# Altium footprint library IC.PcbLib: 386 footprints (part 17 of 30)
Each footprint in its own frame and in the unit in brackets; x right, y up, seen from the top. Pads: shape width x height; smd on the part's side, far side on the other; paste and mask are expansions set on the pad; w line width, h text height; cw(c..) or ccw(c..) is an arc to the next point about the centre after c.
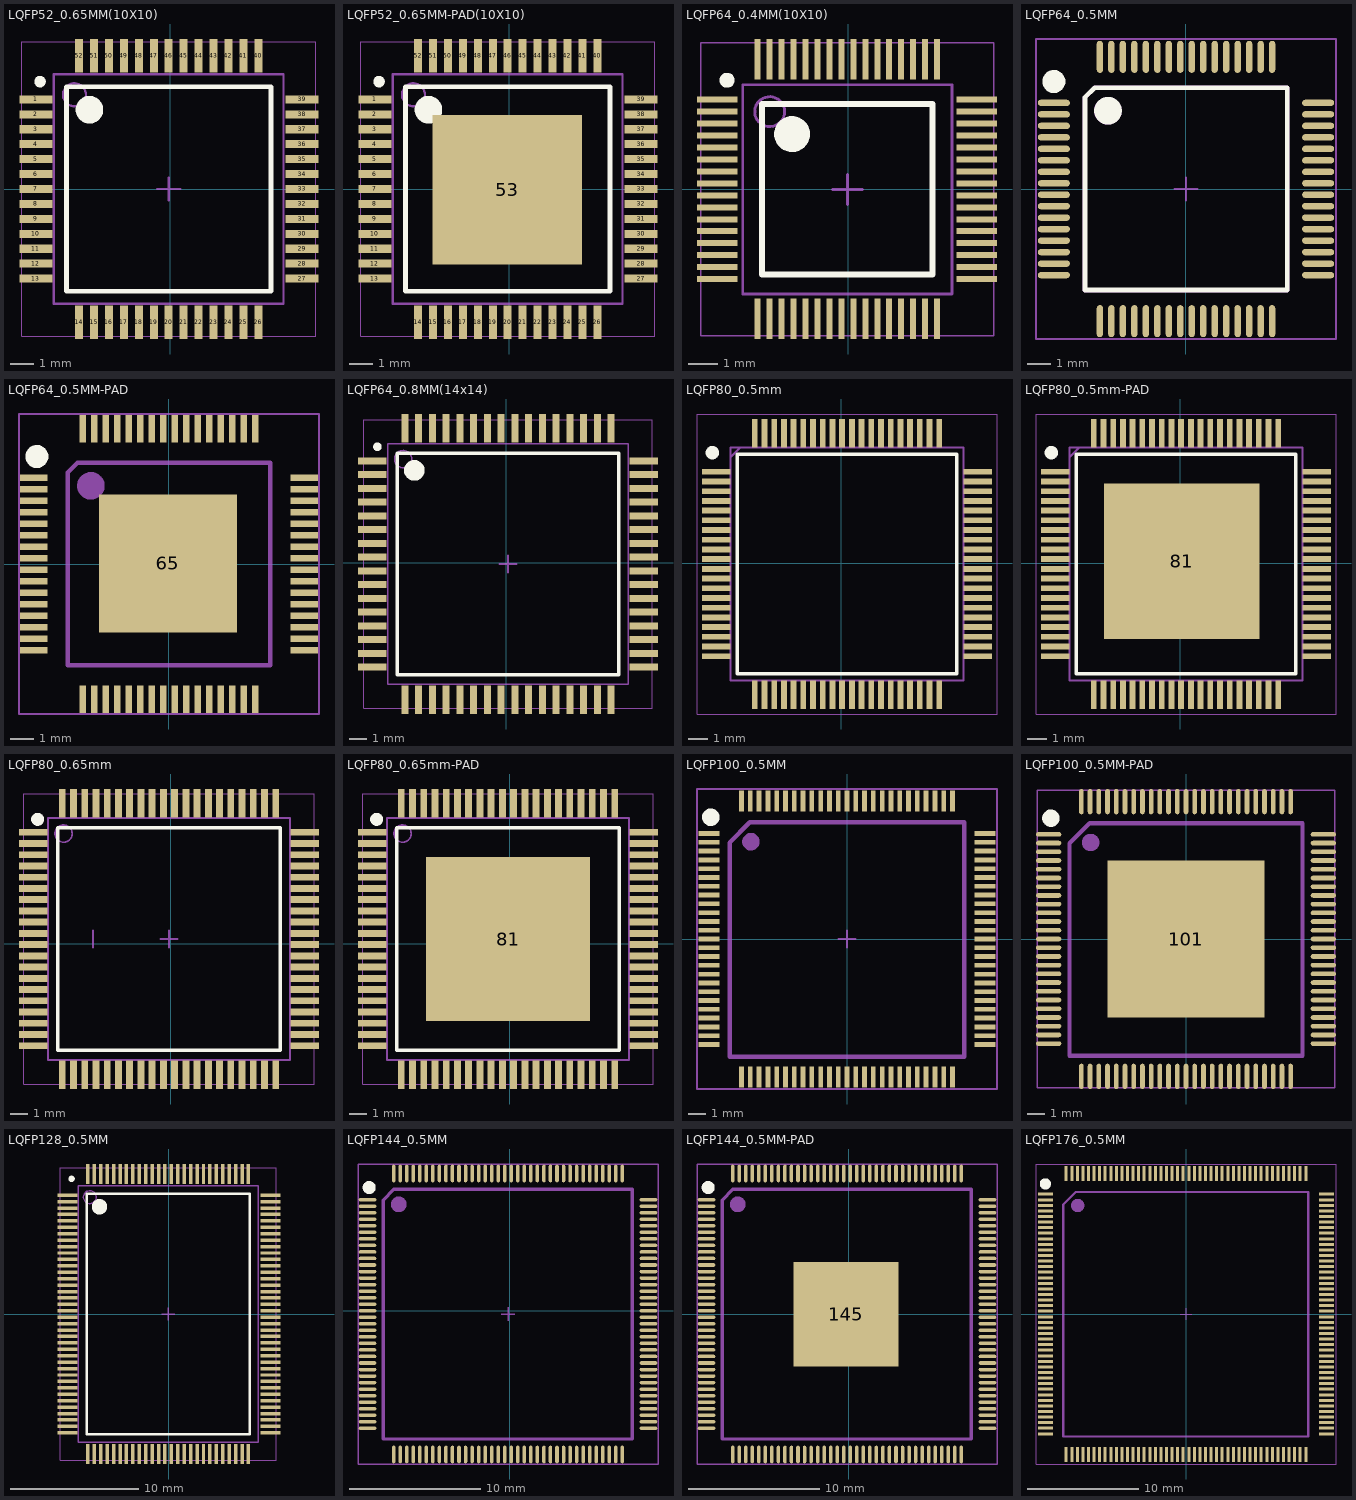
[diagram p16: the footprints below, top view; thin cyan lines are the x and y axes]

## LQFP52_0.65MM(10X10) [mm]
pads (52):
  rect 1.45x0.35 smd: 1(-5.854,3.9) 2(-5.854,3.25) 3(-5.854,2.6) 4(-5.854,1.95) 5(-5.854,1.3) 6(-5.854,0.65) 7(-5.854,0) 8(-5.854,-0.65) 9(-5.854,-1.3) 10(-5.854,-1.95) 11(-5.854,-2.6) 12(-5.854,-3.25) 13(-5.854,-3.9) 27(5.727,-3.9) 28(5.727,-3.25) 29(5.727,-2.6) 30(5.727,-1.95) 31(5.727,-1.3) 32(5.727,-0.65) 33(5.727,0) 34(5.727,0.65) 35(5.727,1.3) 36(5.727,1.95) 37(5.727,2.6) 38(5.727,3.25) 39(5.727,3.9)
  rect 0.35x1.45 smd: 14(-3.976,-5.803) 15(-3.326,-5.803) 16(-2.676,-5.803) 17(-2.026,-5.803) 18(-1.376,-5.803) 19(-0.726,-5.803) 20(-0.076,-5.803) 21(0.574,-5.803) 22(1.224,-5.803) 23(1.874,-5.803) 24(2.524,-5.803) 25(3.174,-5.803) 26(3.824,-5.803) 40(3.824,5.803) 41(3.174,5.803) 42(2.524,5.803) 43(1.874,5.803) 44(1.224,5.803) 45(0.574,5.803) 46(-0.076,5.803) 47(-0.726,5.803) 48(-1.376,5.803) 49(-2.026,5.803) 50(-2.676,5.803) 51(-3.326,5.803) 52(-3.976,5.803)
Top Overlay:
  circle w0.25: c-5.676,4.675 r0.125
  circle w0.6: c-3.526,3.45 r0.3
  lines w0.2: -4.526,-4.45 -4.526,4.45 4.374,4.45 4.374,-4.45 -4.526,-4.45
Mechanical 13:
  circle w0.1: c-4.176,4.1 r0.5
  lines w0.1: -5.076,-5 -5.076,5 4.924,5 4.924,-5 -5.076,-5
Mechanical 15:
  lines w0.05: -6.476,-6.4 -6.476,6.4 6.324,6.4 6.324,-6.4 -6.476,-6.4
  lines w0.1: -0.576,0 0.424,0 ; -0.076,-0.5 -0.076,0.5
3D body "User Library-IPC QFP-full.step": height 1.35, standoff 0, extent -6.094,-6.018 5.942,6.018

## LQFP52_0.65MM-PAD(10X10) [mm]
pads (53):
  rect 1.45x0.35 smd: 1(-5.854,3.9) 2(-5.854,3.25) 3(-5.854,2.6) 4(-5.854,1.95) 5(-5.854,1.3) 6(-5.854,0.65) 7(-5.854,0) 8(-5.854,-0.65) 9(-5.854,-1.3) 10(-5.854,-1.95) 11(-5.854,-2.6) 12(-5.854,-3.25) 13(-5.854,-3.9) 27(5.727,-3.9) 28(5.727,-3.25) 29(5.727,-2.6) 30(5.727,-1.95) 31(5.727,-1.3) 32(5.727,-0.65) 33(5.727,0) 34(5.727,0.65) 35(5.727,1.3) 36(5.727,1.95) 37(5.727,2.6) 38(5.727,3.25) 39(5.727,3.9)
  rect 0.35x1.45 smd: 14(-3.976,-5.803) 15(-3.326,-5.803) 16(-2.676,-5.803) 17(-2.026,-5.803) 18(-1.376,-5.803) 19(-0.726,-5.803) 20(-0.076,-5.803) 21(0.574,-5.803) 22(1.224,-5.803) 23(1.874,-5.803) 24(2.524,-5.803) 25(3.174,-5.803) 26(3.824,-5.803) 40(3.824,5.803) 41(3.174,5.803) 42(2.524,5.803) 43(1.874,5.803) 44(1.224,5.803) 45(0.574,5.803) 46(-0.076,5.803) 47(-0.726,5.803) 48(-1.376,5.803) 49(-2.026,5.803) 50(-2.676,5.803) 51(-3.326,5.803) 52(-3.976,5.803)
  rect 6.5x6.5 smd: 53(-0.102,-0.025)
Top Overlay:
  circle w0.25: c-5.676,4.675 r0.125
  circle w0.6: c-3.526,3.45 r0.3
  lines w0.2: -4.526,-4.45 -4.526,4.45 4.374,4.45 4.374,-4.45 -4.526,-4.45
Mechanical 13:
  circle w0.1: c-4.176,4.1 r0.5
  lines w0.1: -5.076,-5 -5.076,5 4.924,5 4.924,-5 -5.076,-5
Mechanical 15:
  lines w0.05: -6.476,-6.4 -6.476,6.4 6.324,6.4 6.324,-6.4 -6.476,-6.4
  lines w0.1: -0.576,0 0.424,0 ; -0.076,-0.5 -0.076,0.5
3D body "User Library-IPC QFP-full.step": height 1.35, standoff 0, extent -6.094,-6.018 5.942,6.018

## LQFP64_0.4MM(10X10) [mm]
height 1.6
pads (64):
  rect 1.35x0.2 smd: 1(-4.381,3) 2(-4.381,2.6) 3(-4.381,2.2) 4(-4.381,1.8) 5(-4.381,1.4) 6(-4.381,1) 7(-4.381,0.6) 8(-4.381,0.2) 9(-4.381,-0.2) 10(-4.381,-0.6) 11(-4.381,-1) 12(-4.381,-1.4) 13(-4.381,-1.8) 14(-4.381,-2.2) 15(-4.381,-2.6) 16(-4.381,-3) 33(4.304,-3) 34(4.304,-2.6) 35(4.304,-2.2) 36(4.304,-1.8) 37(4.304,-1.4) 38(4.304,-1) 39(4.304,-0.6) 40(4.304,-0.2) 41(4.304,0.2) 42(4.304,0.6) 43(4.304,1) 44(4.304,1.4) 45(4.304,1.8) 46(4.304,2.2) 47(4.304,2.6) 48(4.304,3)
  rect 0.2x1.35 smd: 17(-3.025,-4.33) 18(-2.625,-4.33) 19(-2.225,-4.33) 20(-1.825,-4.33) 21(-1.425,-4.33) 22(-1.025,-4.33) 23(-0.625,-4.33) 24(-0.225,-4.33) 25(0.175,-4.33) 26(0.575,-4.33) 27(0.975,-4.33) 28(1.375,-4.33) 29(1.775,-4.33) 30(2.175,-4.33) 31(2.575,-4.33) 32(2.975,-4.33) 49(2.975,4.355) 50(2.575,4.355) 51(2.175,4.355) 52(1.775,4.355) 53(1.375,4.355) 54(0.975,4.355) 55(0.575,4.355) 56(0.175,4.355) 57(-0.225,4.355) 58(-0.625,4.355) 59(-1.025,4.355) 60(-1.425,4.355) 61(-1.825,4.355) 62(-2.225,4.355) 63(-2.625,4.355) 64(-3.025,4.355)
Top Overlay:
  circle w0.6: c-1.875,1.85 r0.3
  circle w0.25: c-4.05,3.65 r0.125
  lines w0.2: -2.875,-2.85 2.825,-2.85 2.825,2.85 -2.875,2.85 -2.875,-2.85
Mechanical 13:
  circle w0.1: c-2.625,2.6 r0.5
  lines w0.1: -3.525,-3.5 3.475,-3.5 3.475,3.5 -3.525,3.5 -3.525,-3.5
Mechanical 15:
  lines w0.05: -4.925,-4.9 4.875,-4.9 4.875,4.9 -4.925,4.9 -4.925,-4.9
  lines w0.1: -0.525,0 0.475,0 ; -0.025,-0.5 -0.025,0.5
3D body "User Library-LQFP64_7x7mm.step": height 1.6, standoff 0.02, extent -4.525,-4.474 4.475,4.526

## LQFP64_0.5MM [mm]
height 1.6
pads (64):
  oval 1.4x0.27 smd: 1(-5.75,3.75) 2(-5.75,3.25) 3(-5.75,2.75) 4(-5.75,2.25) 5(-5.75,1.75) 6(-5.75,1.25) 7(-5.75,0.75) 8(-5.75,0.25) 9(-5.75,-0.25) 10(-5.75,-0.75) 11(-5.75,-1.25) 12(-5.75,-1.75) 13(-5.75,-2.25) 14(-5.75,-2.75) 15(-5.75,-3.25) 16(-5.75,-3.75) 33(5.75,-3.75) 34(5.75,-3.25) 35(5.75,-2.75) 36(5.75,-2.25) 37(5.75,-1.75) 38(5.75,-1.25) 39(5.75,-0.75) 40(5.75,-0.25) 41(5.75,0.25) 42(5.75,0.75) 43(5.75,1.25) 44(5.75,1.75) 45(5.75,2.25) 46(5.75,2.75) 47(5.75,3.25) 48(5.75,3.75)
  oval 0.27x1.4 smd: 17(-3.75,-5.75) 18(-3.25,-5.75) 19(-2.75,-5.75) 20(-2.25,-5.75) 21(-1.75,-5.75) 22(-1.25,-5.75) 23(-0.75,-5.75) 24(-0.25,-5.75) 25(0.25,-5.75) 26(0.75,-5.75) 27(1.25,-5.75) 28(1.75,-5.75) 29(2.25,-5.75) 30(2.75,-5.75) 31(3.25,-5.75) 32(3.75,-5.75) 49(3.75,5.75) 50(3.25,5.75) 51(2.75,5.75) 52(2.25,5.75) 53(1.75,5.75) 54(1.25,5.75) 55(0.75,5.75) 56(0.25,5.75) 57(-0.25,5.75) 58(-0.75,5.75) 59(-1.25,5.75) 60(-1.75,5.75) 61(-2.25,5.75) 62(-2.75,5.75) 63(-3.25,5.75) 64(-3.75,5.75)
Top Overlay:
  circle w0.5: c-5.75,4.678 r0.25
  circle w0.6: c-3.394,3.406 r0.3
  lines w0.2: -4.394,-4.394 4.406,-4.394 4.406,4.406 -3.976,4.406 -4.394,3.988 -4.394,-4.394
Mechanical 15:
  circle w0.6: c-3.4,3.4 r0.3
  lines w0.1: -0.5,0 0.5,0 ; 0,-0.5 0,0.5 ; -6.528,-6.528 6.528,-6.528 6.528,6.528 -6.528,6.528 -6.528,-6.528
  lines w0.2: -4.4,-4.4 -4.4,3.982 -3.982,4.4 4.4,4.4 4.4,-4.4 -4.4,-4.4
3D body "LQFP64_Grid_0.5.STEP": height 1.6, standoff 0, extent -6.006,-6.009 5.994,5.991

## LQFP64_0.5MM-PAD [mm]
height 1.6
pads (65):
  rect 1.2x0.27 smd: 1(-5.877,3.75) 2(-5.877,3.25) 3(-5.877,2.75) 4(-5.877,2.25) 5(-5.877,1.75) 6(-5.877,1.25) 7(-5.877,0.75) 8(-5.877,0.25) 9(-5.877,-0.25) 10(-5.877,-0.75) 11(-5.877,-1.25) 12(-5.877,-1.75) 13(-5.877,-2.25) 14(-5.877,-2.75) 15(-5.877,-3.25) 16(-5.877,-3.75) 33(5.877,-3.75) 34(5.877,-3.25) 35(5.877,-2.75) 36(5.877,-2.25) 37(5.877,-1.75) 38(5.877,-1.25) 39(5.877,-0.75) 40(5.877,-0.25) 41(5.877,0.25) 42(5.877,0.75) 43(5.877,1.25) 44(5.877,1.75) 45(5.877,2.25) 46(5.877,2.75) 47(5.877,3.25) 48(5.877,3.75)
  rect 0.27x1.2 smd: 17(-3.75,-5.877) 18(-3.25,-5.877) 19(-2.75,-5.877) 20(-2.25,-5.877) 21(-1.75,-5.877) 22(-1.25,-5.877) 23(-0.75,-5.877) 24(-0.25,-5.877) 25(0.25,-5.877) 26(0.75,-5.877) 27(1.25,-5.877) 28(1.75,-5.877) 29(2.25,-5.877) 30(2.75,-5.877) 31(3.25,-5.877) 32(3.75,-5.877) 49(3.75,5.877) 50(3.25,5.877) 51(2.75,5.877) 52(2.25,5.877) 53(1.75,5.877) 54(1.25,5.877) 55(0.75,5.877) 56(0.25,5.877) 57(-0.25,5.877) 58(-0.75,5.877) 59(-1.25,5.877) 60(-1.75,5.877) 61(-2.25,5.877) 62(-2.75,5.877) 63(-3.25,5.877) 64(-3.75,5.877)
  rect 6x6 smd: 65(-0.051,0.025)
Top Overlay:
  circle w0.5: c-5.75,4.678 r0.25
Mechanical 15:
  circle w0.6: c-3.4,3.4 r0.3
  lines w0.1: -0.5,0 0.5,0 ; 0,-0.5 0,0.5 ; -6.528,-6.528 6.528,-6.528 6.528,6.528 -6.528,6.528 -6.528,-6.528
  lines w0.2: -4.4,-4.4 -4.4,3.982 -3.982,4.4 4.4,4.4 4.4,-4.4 -4.4,-4.4
3D body "LQFP64_Grid_0.5.STEP": height 1.6, standoff 0, extent -6.006,-6.009 5.994,5.991

## LQFP64_0.8MM(14x14) [mm]
height 1.6
pads (64):
  rect 1.65x0.4 smd: 1(-7.803,5.924) 2(-7.803,5.124) 3(-7.803,4.324) 4(-7.803,3.524) 5(-7.803,2.724) 6(-7.803,1.924) 7(-7.803,1.124) 8(-7.803,0.324) 9(-7.803,-0.476) 10(-7.803,-1.276) 11(-7.803,-2.076) 12(-7.803,-2.876) 13(-7.803,-3.676) 14(-7.803,-4.476) 15(-7.803,-5.276) 16(-7.803,-6.076) 33(8.006,-6.076) 34(8.006,-5.276) 35(8.006,-4.476) 36(8.006,-3.676) 37(8.006,-2.876) 38(8.006,-2.076) 39(8.006,-1.276) 40(8.006,-0.476) 41(8.006,0.324) 42(8.006,1.124) 43(8.006,1.924) 44(8.006,2.724) 45(8.006,3.524) 46(8.006,4.324) 47(8.006,5.124) 48(8.006,5.924)
  rect 0.4x1.65 smd: 17(-5.898,-7.981) 18(-5.098,-7.981) 19(-4.298,-7.981) 20(-3.498,-7.981) 21(-2.698,-7.981) 22(-1.898,-7.981) 23(-1.098,-7.981) 24(-0.298,-7.981) 25(0.502,-7.981) 26(1.302,-7.981) 27(2.102,-7.981) 28(2.902,-7.981) 29(3.702,-7.981) 30(4.502,-7.981) 31(5.302,-7.981) 32(6.102,-7.981) 49(6.102,7.829) 50(5.302,7.829) 51(4.502,7.829) 52(3.702,7.829) 53(2.902,7.829) 54(2.102,7.829) 55(1.302,7.829) 56(0.502,7.829) 57(-0.298,7.829) 58(-1.098,7.829) 59(-1.898,7.829) 60(-2.698,7.829) 61(-3.498,7.829) 62(-4.298,7.829) 63(-5.098,7.829) 64(-5.898,7.829)
Top Overlay:
  circle w0.6: c-5.348,5.374 r0.3
  circle w0.25: c-7.498,6.749 r0.125
  lines w0.2: -6.348,-6.526 6.552,-6.526 6.552,6.374 -6.348,6.374 -6.348,-6.526
Mechanical 13:
  circle w0.1: c-5.998,6.024 r0.5
  lines w0.1: -6.898,-7.076 7.102,-7.076 7.102,6.924 -6.898,6.924 -6.898,-7.076
Mechanical 15:
  lines w0.05: -8.298,-8.476 8.502,-8.476 8.502,8.324 -8.298,8.324 -8.298,-8.476
  lines w0.1: -0.398,-0.076 0.602,-0.076 ; 0.102,-0.576 0.102,0.424
3D body "TQFP80P1600X1600X120-64N.step": height 1.2, standoff 0, extent -7.898,-8.076 8.102,7.924

## LQFP80_0.5mm [mm]
height 1.6
pads (80):
  rect 1.475x0.3 smd: 1(-6.44,4.711) 2(-6.44,4.211) 3(-6.44,3.711) 4(-6.44,3.211) 5(-6.44,2.711) 6(-6.44,2.211) 7(-6.44,1.711) 8(-6.44,1.211) 9(-6.44,0.711) 10(-6.44,0.211) 11(-6.44,-0.289) 12(-6.44,-0.789) 13(-6.44,-1.289) 14(-6.44,-1.789) 15(-6.44,-2.289) 16(-6.44,-2.789) 17(-6.44,-3.289) 18(-6.44,-3.789) 19(-6.44,-4.289) 20(-6.44,-4.789) 41(7.036,-4.789) 42(7.036,-4.289) 43(7.036,-3.789) 44(7.036,-3.289) 45(7.036,-2.789) 46(7.036,-2.289) 47(7.036,-1.789) 48(7.036,-1.289) 49(7.036,-0.789) 50(7.036,-0.289) 51(7.036,0.211) 52(7.036,0.711) 53(7.036,1.211) 54(7.036,1.711) 55(7.036,2.211) 56(7.036,2.711) 57(7.036,3.211) 58(7.036,3.711) 59(7.036,4.211) 60(7.036,4.711)
  rect 0.3x1.475 smd: 21(-4.452,-6.777) 22(-3.952,-6.777) 23(-3.452,-6.777) 24(-2.952,-6.777) 25(-2.452,-6.777) 26(-1.952,-6.777) 27(-1.452,-6.777) 28(-0.952,-6.777) 29(-0.452,-6.777) 30(0.048,-6.777) 31(0.548,-6.777) 32(1.048,-6.777) 33(1.548,-6.777) 34(2.048,-6.777) 35(2.548,-6.777) 36(3.048,-6.777) 37(3.548,-6.777) 38(4.048,-6.777) 39(4.548,-6.777) 40(5.048,-6.777) 61(5.048,6.699) 62(4.548,6.699) 63(4.048,6.699) 64(3.548,6.699) 65(3.048,6.699) 66(2.548,6.699) 67(2.048,6.699) 68(1.548,6.699) 69(1.048,6.699) 70(0.548,6.699) 71(0.048,6.699) 72(-0.452,6.699) 73(-0.952,6.699) 74(-1.452,6.699) 75(-1.952,6.699) 76(-2.452,6.699) 77(-2.952,6.699) 78(-3.452,6.699) 79(-3.952,6.699) 80(-4.452,6.699)
Top Overlay:
  circle w0.5: c-6.639,5.694 r0.094
  lines w0.2: -5.352,-5.689 -5.352,5.611 5.948,5.611 5.948,-5.689 -5.352,-5.689
Mechanical 13:
  lines w0.1: -5.702,5.461 -5.202,5.961 ; -5.702,-6.039 -5.702,5.961 6.298,5.961 6.298,-6.039 -5.702,-6.039
Mechanical 15:
  lines w0.05: -7.427,-7.764 -7.427,7.686 8.023,7.686 8.023,-7.764 -7.427,-7.764
3D body "TMS320F28035PNT.stp": height 1.6, standoff 0, extent -6.702,-7.039 7.298,6.961

## LQFP80_0.5mm-PAD [mm]
height 1.6
pads (81):
  rect 1.475x0.3 smd: 1(-6.44,4.711) 2(-6.44,4.211) 3(-6.44,3.711) 4(-6.44,3.211) 5(-6.44,2.711) 6(-6.44,2.211) 7(-6.44,1.711) 8(-6.44,1.211) 9(-6.44,0.711) 10(-6.44,0.211) 11(-6.44,-0.289) 12(-6.44,-0.789) 13(-6.44,-1.289) 14(-6.44,-1.789) 15(-6.44,-2.289) 16(-6.44,-2.789) 17(-6.44,-3.289) 18(-6.44,-3.789) 19(-6.44,-4.289) 20(-6.44,-4.789) 41(7.036,-4.789) 42(7.036,-4.289) 43(7.036,-3.789) 44(7.036,-3.289) 45(7.036,-2.789) 46(7.036,-2.289) 47(7.036,-1.789) 48(7.036,-1.289) 49(7.036,-0.789) 50(7.036,-0.289) 51(7.036,0.211) 52(7.036,0.711) 53(7.036,1.211) 54(7.036,1.711) 55(7.036,2.211) 56(7.036,2.711) 57(7.036,3.211) 58(7.036,3.711) 59(7.036,4.211) 60(7.036,4.711)
  rect 0.3x1.475 smd: 21(-4.452,-6.777) 22(-3.952,-6.777) 23(-3.452,-6.777) 24(-2.952,-6.777) 25(-2.452,-6.777) 26(-1.952,-6.777) 27(-1.452,-6.777) 28(-0.952,-6.777) 29(-0.452,-6.777) 30(0.048,-6.777) 31(0.548,-6.777) 32(1.048,-6.777) 33(1.548,-6.777) 34(2.048,-6.777) 35(2.548,-6.777) 36(3.048,-6.777) 37(3.548,-6.777) 38(4.048,-6.777) 39(4.548,-6.777) 40(5.048,-6.777) 61(5.048,6.699) 62(4.548,6.699) 63(4.048,6.699) 64(3.548,6.699) 65(3.048,6.699) 66(2.548,6.699) 67(2.048,6.699) 68(1.548,6.699) 69(1.048,6.699) 70(0.548,6.699) 71(0.048,6.699) 72(-0.452,6.699) 73(-0.952,6.699) 74(-1.452,6.699) 75(-1.952,6.699) 76(-2.452,6.699) 77(-2.952,6.699) 78(-3.452,6.699) 79(-3.952,6.699) 80(-4.452,6.699)
  rect 8x8 smd: 81(0.076,0.102)
Top Overlay:
  circle w0.5: c-6.639,5.694 r0.094
  lines w0.2: -5.352,-5.689 -5.352,5.611 5.948,5.611 5.948,-5.689 -5.352,-5.689
Mechanical 13:
  lines w0.1: -5.702,5.461 -5.202,5.961 ; -5.702,-6.039 -5.702,5.961 6.298,5.961 6.298,-6.039 -5.702,-6.039
Mechanical 15:
  lines w0.05: -7.427,-7.764 -7.427,7.686 8.023,7.686 8.023,-7.764 -7.427,-7.764
3D body "TMS320F28035PNT.stp": height 1.6, standoff 0, extent -6.702,-7.039 7.298,6.961

## LQFP80_0.65mm [mm]
height 1.6
pads (80):
  rect 1.65x0.4 smd: 1(-7.956,6.454) 2(-7.956,5.804) 3(-7.956,5.154) 4(-7.956,4.504) 5(-7.956,3.854) 6(-7.956,3.204) 7(-7.956,2.554) 8(-7.956,1.904) 9(-7.956,1.254) 10(-7.956,0.604) 11(-7.956,-0.046) 12(-7.956,-0.696) 13(-7.956,-1.346) 14(-7.956,-1.996) 15(-7.956,-2.646) 16(-7.956,-3.296) 17(-7.956,-3.946) 18(-7.956,-4.596) 19(-7.956,-5.246) 20(-7.956,-5.896) 41(7.752,-5.896) 42(7.752,-5.246) 43(7.752,-4.596) 44(7.752,-3.946) 45(7.752,-3.296) 46(7.752,-2.646) 47(7.752,-1.996) 48(7.752,-1.346) 49(7.752,-0.696) 50(7.752,-0.046) 51(7.752,0.604) 52(7.752,1.254) 53(7.752,1.904) 54(7.752,2.554) 55(7.752,3.204) 56(7.752,3.854) 57(7.752,4.504) 58(7.752,5.154) 59(7.752,5.804) 60(7.752,6.454)
  rect 0.4x1.65 smd: 21(-6.277,-7.575) 22(-5.627,-7.575) 23(-4.977,-7.575) 24(-4.327,-7.575) 25(-3.677,-7.575) 26(-3.027,-7.575) 27(-2.377,-7.575) 28(-1.727,-7.575) 29(-1.077,-7.575) 30(-0.427,-7.575) 31(0.223,-7.575) 32(0.873,-7.575) 33(1.523,-7.575) 34(2.173,-7.575) 35(2.823,-7.575) 36(3.473,-7.575) 37(4.123,-7.575) 38(4.773,-7.575) 39(5.423,-7.575) 40(6.073,-7.575) 61(6.073,8.133) 62(5.423,8.133) 63(4.773,8.133) 64(4.123,8.133) 65(3.473,8.133) 66(2.823,8.133) 67(2.173,8.133) 68(1.523,8.133) 69(0.873,8.133) 70(0.223,8.133) 71(-0.427,8.133) 72(-1.077,8.133) 73(-1.727,8.133) 74(-2.377,8.133) 75(-3.027,8.133) 76(-3.677,8.133) 77(-4.327,8.133) 78(-4.977,8.133) 79(-5.627,8.133) 80(-6.277,8.133)
Top Overlay:
  circle w0.5: c-7.702,7.204 r0.125
  lines w0.2: -6.552,-6.171 -6.552,6.729 6.348,6.729 6.348,-6.171 -6.552,-6.171
Mechanical 13:
  circle w0.1: c-6.202,6.379 r0.5
  lines w0.1: -7.102,-6.721 -7.102,7.279 6.898,7.279 6.898,-6.721 -7.102,-6.721
Mechanical 15:
  lines w0.05: -8.502,-8.121 -8.502,8.679 8.298,8.679 8.298,-8.121 -8.502,-8.121
  lines w0.1: -4.502,-0.221 -4.502,0.779 ; -0.602,0.279 0.398,0.279 ; -0.102,-0.221 -0.102,0.779
3D body "User Library-LQFP-80 14x14.step": height 1.6, standoff 0.01, extent -8.128,-7.725 7.881,8.284

## LQFP80_0.65mm-PAD [mm]
height 1.6
pads (81):
  rect 1.65x0.4 smd: 1(-7.956,6.454) 2(-7.956,5.804) 3(-7.956,5.154) 4(-7.956,4.504) 5(-7.956,3.854) 6(-7.956,3.204) 7(-7.956,2.554) 8(-7.956,1.904) 9(-7.956,1.254) 10(-7.956,0.604) 11(-7.956,-0.046) 12(-7.956,-0.696) 13(-7.956,-1.346) 14(-7.956,-1.996) 15(-7.956,-2.646) 16(-7.956,-3.296) 17(-7.956,-3.946) 18(-7.956,-4.596) 19(-7.956,-5.246) 20(-7.956,-5.896) 41(7.752,-5.896) 42(7.752,-5.246) 43(7.752,-4.596) 44(7.752,-3.946) 45(7.752,-3.296) 46(7.752,-2.646) 47(7.752,-1.996) 48(7.752,-1.346) 49(7.752,-0.696) 50(7.752,-0.046) 51(7.752,0.604) 52(7.752,1.254) 53(7.752,1.904) 54(7.752,2.554) 55(7.752,3.204) 56(7.752,3.854) 57(7.752,4.504) 58(7.752,5.154) 59(7.752,5.804) 60(7.752,6.454)
  rect 0.4x1.65 smd: 21(-6.277,-7.575) 22(-5.627,-7.575) 23(-4.977,-7.575) 24(-4.327,-7.575) 25(-3.677,-7.575) 26(-3.027,-7.575) 27(-2.377,-7.575) 28(-1.727,-7.575) 29(-1.077,-7.575) 30(-0.427,-7.575) 31(0.223,-7.575) 32(0.873,-7.575) 33(1.523,-7.575) 34(2.173,-7.575) 35(2.823,-7.575) 36(3.473,-7.575) 37(4.123,-7.575) 38(4.773,-7.575) 39(5.423,-7.575) 40(6.073,-7.575) 61(6.073,8.133) 62(5.423,8.133) 63(4.773,8.133) 64(4.123,8.133) 65(3.473,8.133) 66(2.823,8.133) 67(2.173,8.133) 68(1.523,8.133) 69(0.873,8.133) 70(0.223,8.133) 71(-0.427,8.133) 72(-1.077,8.133) 73(-1.727,8.133) 74(-2.377,8.133) 75(-3.027,8.133) 76(-3.677,8.133) 77(-4.327,8.133) 78(-4.977,8.133) 79(-5.627,8.133) 80(-6.277,8.133)
  rect 9.5x9.5 smd: 81(-0.102,0.279)
Top Overlay:
  circle w0.5: c-7.702,7.204 r0.125
  lines w0.2: -6.552,-6.171 6.348,-6.171 6.348,6.729 -6.552,6.729 -6.552,-6.171
Mechanical 13:
  circle w0.1: c-6.202,6.379 r0.5
  lines w0.1: -7.102,-6.721 6.898,-6.721 6.898,7.279 -7.102,7.279 -7.102,-6.721
Mechanical 15:
  lines w0.05: -8.502,-8.121 8.298,-8.121 8.298,8.679 -8.502,8.679 -8.502,-8.121
  lines w0.1: -4.502,-0.221 -4.502,0.779 ; -0.602,0.279 0.398,0.279 ; -0.102,-0.221 -0.102,0.779
3D body "User Library-LQFP-80 14x14.step": height 1.6, standoff 0.01, extent -8.128,-7.725 7.881,8.284

## LQFP100_0.5MM [mm]
pads (100):
  rect 1.2x0.27 smd: 1(-7.852,6) 2(-7.852,5.5) 3(-7.852,5) 4(-7.852,4.5) 5(-7.852,4) 6(-7.852,3.5) 7(-7.852,3) 8(-7.852,2.5) 9(-7.852,2) 10(-7.852,1.5) 11(-7.852,1) 12(-7.852,0.5) 13(-7.852,0) 14(-7.852,-0.5) 15(-7.852,-1) 16(-7.852,-1.5) 17(-7.852,-2) 18(-7.852,-2.5) 19(-7.852,-3) 20(-7.852,-3.5) 21(-7.852,-4) 22(-7.852,-4.5) 23(-7.852,-5) 24(-7.852,-5.5) 25(-7.852,-6) 51(7.852,-6) 52(7.852,-5.5) 53(7.852,-5) 54(7.852,-4.5) 55(7.852,-4) 56(7.852,-3.5) 57(7.852,-3) 58(7.852,-2.5) 59(7.852,-2) 60(7.852,-1.5) 61(7.852,-1) 62(7.852,-0.5) 63(7.852,0) 64(7.852,0.5) 65(7.852,1) 66(7.852,1.5) 67(7.852,2) 68(7.852,2.5) 69(7.852,3) 70(7.852,3.5) 71(7.852,4) 72(7.852,4.5) 73(7.852,5) 74(7.852,5.5) 75(7.852,6)
  rect 0.27x1.2 smd: 26(-6,-7.852) 27(-5.5,-7.852) 28(-5,-7.852) 29(-4.5,-7.852) 30(-4,-7.852) 31(-3.5,-7.852) 32(-3,-7.852) 33(-2.5,-7.852) 34(-2,-7.852) 35(-1.5,-7.852) 36(-1,-7.852) 37(-0.5,-7.852) 38(0,-7.852) 39(0.5,-7.852) 40(1,-7.852) 41(1.5,-7.852) 42(2,-7.852) 43(2.5,-7.852) 44(3,-7.852) 45(3.5,-7.852) 46(4,-7.852) 47(4.5,-7.852) 48(5,-7.852) 49(5.5,-7.852) 50(6,-7.852) 76(6,7.852) 77(5.5,7.852) 78(5,7.852) 79(4.5,7.852) 80(4,7.852) 81(3.5,7.852) 82(3,7.852) 83(2.5,7.852) 84(2,7.852) 85(1.5,7.852) 86(1,7.852) 87(0.5,7.852) 88(0,7.852) 89(-0.5,7.852) 90(-1,7.852) 91(-1.5,7.852) 92(-2,7.852) 93(-2.5,7.852) 94(-3,7.852) 95(-3.5,7.852) 96(-4,7.852) 97(-4.5,7.852) 98(-5,7.852) 99(-5.5,7.852) 100(-6,7.852)
Top Overlay:
  circle w0.5: c-7.75,6.928 r0.25
Mechanical 15:
  circle w0.5: c-5.467,5.536 r0.25
  lines w0.1: -0.5,0 0.5,0 ; 0,-0.5 0,0.5 ; -8.534,-8.534 -8.534,8.534 8.534,8.534 8.534,-8.534 -8.534,-8.534
  lines w0.254: -6.679,-6.7 6.681,-6.7 6.681,6.635 -5.532,6.635 -6.679,5.487 -6.679,-6.7
3D body "lqfp100.stp": height 1.5, standoff 0, extent -8,-8 8,8

## LQFP100_0.5MM-PAD [mm]
pads (101):
  oval 1.45x0.27 smd: 1(-7.877,6) 2(-7.877,5.5) 3(-7.877,5) 4(-7.877,4.5) 5(-7.877,4) 6(-7.877,3.5) 7(-7.877,3) 8(-7.877,2.5) 9(-7.877,2) 10(-7.877,1.5) 11(-7.877,1) 12(-7.877,0.5) 13(-7.877,0) 14(-7.877,-0.5) 15(-7.877,-1) 16(-7.877,-1.5) 17(-7.877,-2) 18(-7.877,-2.5) 19(-7.877,-3) 20(-7.877,-3.5) 21(-7.877,-4) 22(-7.877,-4.5) 23(-7.877,-5) 24(-7.877,-5.5) 25(-7.877,-6) 51(7.877,-6) 52(7.877,-5.5) 53(7.877,-5) 54(7.877,-4.5) 55(7.877,-4) 56(7.877,-3.5) 57(7.877,-3) 58(7.877,-2.5) 59(7.877,-2) 60(7.877,-1.5) 61(7.877,-1) 62(7.877,-0.5) 63(7.877,0) 64(7.877,0.5) 65(7.877,1) 66(7.877,1.5) 67(7.877,2) 68(7.877,2.5) 69(7.877,3) 70(7.877,3.5) 71(7.877,4) 72(7.877,4.5) 73(7.877,5) 74(7.877,5.5) 75(7.877,6)
  oval 0.27x1.45 smd: 26(-6,-7.877) 27(-5.5,-7.877) 28(-5,-7.877) 29(-4.5,-7.877) 30(-4,-7.877) 31(-3.5,-7.877) 32(-3,-7.877) 33(-2.5,-7.877) 34(-2,-7.877) 35(-1.5,-7.877) 36(-1,-7.877) 37(-0.5,-7.877) 38(0,-7.877) 39(0.5,-7.877) 40(1,-7.877) 41(1.5,-7.877) 42(2,-7.877) 43(2.5,-7.877) 44(3,-7.877) 45(3.5,-7.877) 46(4,-7.877) 47(4.5,-7.877) 48(5,-7.877) 49(5.5,-7.877) 50(6,-7.877) 76(6,7.877) 77(5.5,7.877) 78(5,7.877) 79(4.5,7.877) 80(4,7.877) 81(3.5,7.877) 82(3,7.877) 83(2.5,7.877) 84(2,7.877) 85(1.5,7.877) 86(1,7.877) 87(0.5,7.877) 88(0,7.877) 89(-0.5,7.877) 90(-1,7.877) 91(-1.5,7.877) 92(-2,7.877) 93(-2.5,7.877) 94(-3,7.877) 95(-3.5,7.877) 96(-4,7.877) 97(-4.5,7.877) 98(-5,7.877) 99(-5.5,7.877) 100(-6,7.877)
  rect 9x9 smd: 101(0,0)
Top Overlay:
  circle w0.5: c-7.75,6.928 r0.25
Mechanical 15:
  circle w0.5: c-5.467,5.536 r0.25
  lines w0.1: -0.5,0 0.5,0 ; 0,-0.5 0,0.5 ; -8.534,-8.534 8.534,-8.534 8.534,8.534 -8.534,8.534 -8.534,-8.534
  lines w0.254: -6.679,-6.7 -6.679,5.487 -5.532,6.635 6.681,6.635 6.681,-6.7 -6.679,-6.7
3D body "lqfp100.stp": height 1.5, standoff 0, extent -8,-8 8,8

## LQFP128_0.5MM [mm]
height 1.6
pads (128):
  rect 1.55x0.27 smd: 1(-7.855,9.25) 2(-7.855,8.75) 3(-7.855,8.25) 4(-7.855,7.75) 5(-7.855,7.25) 6(-7.855,6.75) 7(-7.855,6.25) 8(-7.855,5.75) 9(-7.855,5.25) 10(-7.855,4.75) 11(-7.855,4.25) 12(-7.855,3.75) 13(-7.855,3.25) 14(-7.855,2.75) 15(-7.855,2.25) 16(-7.855,1.75) 17(-7.855,1.25) 18(-7.855,0.75) 19(-7.855,0.25) 20(-7.855,-0.25) 21(-7.855,-0.75) 22(-7.855,-1.25) 23(-7.855,-1.75) 24(-7.855,-2.25) 25(-7.855,-2.75) 26(-7.855,-3.25) 27(-7.855,-3.75) 28(-7.855,-4.25) 29(-7.855,-4.75) 30(-7.855,-5.25) 31(-7.855,-5.75) 32(-7.855,-6.25) 33(-7.855,-6.75) 34(-7.855,-7.25) 35(-7.855,-7.75) 36(-7.855,-8.25) 37(-7.855,-8.75) 38(-7.855,-9.25) 65(7.931,-9.25) 66(7.931,-8.75) 67(7.931,-8.25) 68(7.931,-7.75) 69(7.931,-7.25) 70(7.931,-6.75) 71(7.931,-6.25) 72(7.931,-5.75) 73(7.931,-5.25) 74(7.931,-4.75) 75(7.931,-4.25) 76(7.931,-3.75) 77(7.931,-3.25) 78(7.931,-2.75) 79(7.931,-2.25) 80(7.931,-1.75) 81(7.931,-1.25) 82(7.931,-0.75) 83(7.931,-0.25) 84(7.931,0.25) 85(7.931,0.75) 86(7.931,1.25) 87(7.931,1.75) 88(7.931,2.25) 89(7.931,2.75) 90(7.931,3.25) 91(7.931,3.75) 92(7.931,4.25) 93(7.931,4.75) 94(7.931,5.25) 95(7.931,5.75) 96(7.931,6.25) 97(7.931,6.75) 98(7.931,7.25) 99(7.931,7.75) 100(7.931,8.25) 101(7.931,8.75) 102(7.931,9.25)
  rect 0.27x1.55 smd: 39(-6.275,-10.906) 40(-5.775,-10.906) 41(-5.275,-10.906) 42(-4.775,-10.906) 43(-4.275,-10.906) 44(-3.775,-10.906) 45(-3.275,-10.906) 46(-2.775,-10.906) 47(-2.275,-10.906) 48(-1.775,-10.906) 49(-1.275,-10.906) 50(-0.775,-10.906) 51(-0.275,-10.906) 52(0.225,-10.906) 53(0.725,-10.906) 54(1.225,-10.906) 55(1.725,-10.906) 56(2.225,-10.906) 57(2.725,-10.906) 58(3.225,-10.906) 59(3.725,-10.906) 60(4.225,-10.906) 61(4.725,-10.906) 62(5.225,-10.906) 63(5.725,-10.906) 64(6.225,-10.906) 103(6.225,10.906) 104(5.725,10.906) 105(5.225,10.906) 106(4.725,10.906) 107(4.225,10.906) 108(3.725,10.906) 109(3.225,10.906) 110(2.725,10.906) 111(2.225,10.906) 112(1.725,10.906) 113(1.225,10.906) 114(0.725,10.906) 115(0.225,10.906) 116(-0.275,10.906) 117(-0.775,10.906) 118(-1.275,10.906) 119(-1.775,10.906) 120(-2.275,10.906) 121(-2.775,10.906) 122(-3.275,10.906) 123(-3.775,10.906) 124(-4.275,10.906) 125(-4.775,10.906) 126(-5.275,10.906) 127(-5.775,10.906) 128(-6.275,10.906)
Top Overlay:
  circle w0.25: c-7.55,10.525 r0.125
  circle w0.6: c-5.375,8.35 r0.3
  lines w0.2: -6.375,-9.35 -6.375,9.35 6.325,9.35 6.325,-9.35 -6.375,-9.35
Mechanical 13:
  circle w0.1: c-6.125,9.1 r0.5
  lines w0.1: -7.025,-10 -7.025,10 6.975,10 6.975,-10 -7.025,-10
Mechanical 15:
  lines w0.05: -8.425,-11.4 -8.425,11.4 8.375,11.4 8.375,-11.4 -8.425,-11.4
  lines w0.1: -0.525,0 0.475,0 ; -0.025,-0.5 -0.025,0.5
3D body "User Library-LQFP-144-1.step": height 1.55, standoff 0, extent -8.026,-11.201 8.186,11.014

## LQFP144_0.5MM [mm]
pads (144):
  oval 1.35x0.27 smd: 1(-10.904,8.496) 2(-10.904,7.996) 3(-10.904,7.496) 4(-10.904,6.996) 5(-10.904,6.496) 6(-10.904,5.996) 7(-10.904,5.496) 8(-10.904,4.996) 9(-10.904,4.496) 10(-10.904,3.996) 11(-10.904,3.496) 12(-10.904,2.996) 13(-10.904,2.496) 14(-10.904,1.996) 15(-10.904,1.496) 16(-10.904,0.996) 17(-10.904,0.496) 18(-10.904,-0.004) 19(-10.904,-0.504) 20(-10.904,-1.004) 21(-10.904,-1.504) 22(-10.904,-2.004) 23(-10.904,-2.504) 24(-10.904,-3.004) 25(-10.904,-3.504) 26(-10.904,-4.004) 27(-10.904,-4.504) 28(-10.904,-5.004) 29(-10.904,-5.504) 30(-10.904,-6.004) 31(-10.904,-6.504) 32(-10.904,-7.004) 33(-10.904,-7.504) 34(-10.904,-8.004) 35(-10.904,-8.504) 36(-10.904,-9.004) 73(10.6,-9.004) 74(10.6,-8.504) 75(10.6,-8.004) 76(10.6,-7.504) 77(10.6,-7.004) 78(10.6,-6.504) 79(10.6,-6.004) 80(10.6,-5.504) 81(10.6,-5.004) 82(10.6,-4.504) 83(10.6,-4.004) 84(10.6,-3.504) 85(10.6,-3.004) 86(10.6,-2.504) 87(10.6,-2.004) 88(10.6,-1.504) 89(10.6,-1.004) 90(10.6,-0.504) 91(10.6,-0.004) 92(10.6,0.496) 93(10.6,0.996) 94(10.6,1.496) 95(10.6,1.996) 96(10.6,2.496) 97(10.6,2.996) 98(10.6,3.496) 99(10.6,3.996) 100(10.6,4.496) 101(10.6,4.996) 102(10.6,5.496) 103(10.6,5.996) 104(10.6,6.496) 105(10.6,6.996) 106(10.6,7.496) 107(10.6,7.996) 108(10.6,8.496)
  oval 0.27x1.35 smd: 37(-8.902,-11.006) 38(-8.402,-11.006) 39(-7.902,-11.006) 40(-7.402,-11.006) 41(-6.902,-11.006) 42(-6.402,-11.006) 43(-5.902,-11.006) 44(-5.402,-11.006) 45(-4.902,-11.006) 46(-4.402,-11.006) 47(-3.902,-11.006) 48(-3.402,-11.006) 49(-2.902,-11.006) 50(-2.402,-11.006) 51(-1.902,-11.006) 52(-1.402,-11.006) 53(-0.902,-11.006) 54(-0.402,-11.006) 55(0.098,-11.006) 56(0.598,-11.006) 57(1.098,-11.006) 58(1.598,-11.006) 59(2.098,-11.006) 60(2.598,-11.006) 61(3.098,-11.006) 62(3.598,-11.006) 63(4.098,-11.006) 64(4.598,-11.006) 65(5.098,-11.006) 66(5.598,-11.006) 67(6.098,-11.006) 68(6.598,-11.006) 69(7.098,-11.006) 70(7.598,-11.006) 71(8.098,-11.006) 72(8.598,-11.006) 109(8.598,10.498) 110(8.098,10.498) 111(7.598,10.498) 112(7.098,10.498) 113(6.598,10.498) 114(6.098,10.498) 115(5.598,10.498) 116(5.098,10.498) 117(4.598,10.498) 118(4.098,10.498) 119(3.598,10.498) 120(3.098,10.498) 121(2.598,10.498) 122(2.098,10.498) 123(1.598,10.498) 124(1.098,10.498) 125(0.598,10.498) 126(0.098,10.498) 127(-0.402,10.498) 128(-0.902,10.498) 129(-1.402,10.498) 130(-1.902,10.498) 131(-2.402,10.498) 132(-2.902,10.498) 133(-3.402,10.498) 134(-3.902,10.498) 135(-4.402,10.498) 136(-4.902,10.498) 137(-5.402,10.498) 138(-5.902,10.498) 139(-6.402,10.498) 140(-6.902,10.498) 141(-7.402,10.498) 142(-7.902,10.498) 143(-8.402,10.498) 144(-8.902,10.498)
Top Overlay:
  circle w0.5: c-10.777,9.424 r0.25
Mechanical 15:
  circle w0.6: c-8.513,8.137 r0.3
  lines w0.1: -0.652,-0.254 0.348,-0.254 ; -0.152,-0.754 -0.152,0.246 ; -11.633,-11.735 11.328,-11.735 11.328,11.227 -11.633,11.227 -11.633,-11.735
  lines w0.254: -9.705,-9.817 -9.705,8.471 -8.892,9.283 9.345,9.283 9.345,-9.817 -9.705,-9.817
3D body "lqfp144.stp": height 1.5, standoff 0, extent -11.152,-11.254 10.848,10.746

## LQFP144_0.5MM-PAD [mm]
pads (145):
  oval 1.35x0.27 smd: 1(-10.904,8.75) 2(-10.904,8.25) 3(-10.904,7.75) 4(-10.904,7.25) 5(-10.904,6.75) 6(-10.904,6.25) 7(-10.904,5.75) 8(-10.904,5.25) 9(-10.904,4.75) 10(-10.904,4.25) 11(-10.904,3.75) 12(-10.904,3.25) 13(-10.904,2.75) 14(-10.904,2.25) 15(-10.904,1.75) 16(-10.904,1.25) 17(-10.904,0.75) 18(-10.904,0.25) 19(-10.904,-0.25) 20(-10.904,-0.75) 21(-10.904,-1.25) 22(-10.904,-1.75) 23(-10.904,-2.25) 24(-10.904,-2.75) 25(-10.904,-3.25) 26(-10.904,-3.75) 27(-10.904,-4.25) 28(-10.904,-4.75) 29(-10.904,-5.25) 30(-10.904,-5.75) 31(-10.904,-6.25) 32(-10.904,-6.75) 33(-10.904,-7.25) 34(-10.904,-7.75) 35(-10.904,-8.25) 36(-10.904,-8.75) 73(10.6,-8.75) 74(10.6,-8.25) 75(10.6,-7.75) 76(10.6,-7.25) 77(10.6,-6.75) 78(10.6,-6.25) 79(10.6,-5.75) 80(10.6,-5.25) 81(10.6,-4.75) 82(10.6,-4.25) 83(10.6,-3.75) 84(10.6,-3.25) 85(10.6,-2.75) 86(10.6,-2.25) 87(10.6,-1.75) 88(10.6,-1.25) 89(10.6,-0.75) 90(10.6,-0.25) 91(10.6,0.25) 92(10.6,0.75) 93(10.6,1.25) 94(10.6,1.75) 95(10.6,2.25) 96(10.6,2.75) 97(10.6,3.25) 98(10.6,3.75) 99(10.6,4.25) 100(10.6,4.75) 101(10.6,5.25) 102(10.6,5.75) 103(10.6,6.25) 104(10.6,6.75) 105(10.6,7.25) 106(10.6,7.75) 107(10.6,8.25) 108(10.6,8.75)
  oval 0.27x1.35 smd: 37(-8.902,-10.752) 38(-8.402,-10.752) 39(-7.902,-10.752) 40(-7.402,-10.752) 41(-6.902,-10.752) 42(-6.402,-10.752) 43(-5.902,-10.752) 44(-5.402,-10.752) 45(-4.902,-10.752) 46(-4.402,-10.752) 47(-3.902,-10.752) 48(-3.402,-10.752) 49(-2.902,-10.752) 50(-2.402,-10.752) 51(-1.902,-10.752) 52(-1.402,-10.752) 53(-0.902,-10.752) 54(-0.402,-10.752) 55(0.098,-10.752) 56(0.598,-10.752) 57(1.098,-10.752) 58(1.598,-10.752) 59(2.098,-10.752) 60(2.598,-10.752) 61(3.098,-10.752) 62(3.598,-10.752) 63(4.098,-10.752) 64(4.598,-10.752) 65(5.098,-10.752) 66(5.598,-10.752) 67(6.098,-10.752) 68(6.598,-10.752) 69(7.098,-10.752) 70(7.598,-10.752) 71(8.098,-10.752) 72(8.598,-10.752) 109(8.598,10.752) 110(8.098,10.752) 111(7.598,10.752) 112(7.098,10.752) 113(6.598,10.752) 114(6.098,10.752) 115(5.598,10.752) 116(5.098,10.752) 117(4.598,10.752) 118(4.098,10.752) 119(3.598,10.752) 120(3.098,10.752) 121(2.598,10.752) 122(2.098,10.752) 123(1.598,10.752) 124(1.098,10.752) 125(0.598,10.752) 126(0.098,10.752) 127(-0.402,10.752) 128(-0.902,10.752) 129(-1.402,10.752) 130(-1.902,10.752) 131(-2.402,10.752) 132(-2.902,10.752) 133(-3.402,10.752) 134(-3.902,10.752) 135(-4.402,10.752) 136(-4.902,10.752) 137(-5.402,10.752) 138(-5.902,10.752) 139(-6.402,10.752) 140(-6.902,10.752) 141(-7.402,10.752) 142(-7.902,10.752) 143(-8.402,10.752) 144(-8.902,10.752)
  rect 8x8 smd: 145(-0.229,-0.025)
Top Overlay:
  circle w0.5: c-10.777,9.678 r0.25
Mechanical 15:
  circle w0.6: c-8.513,8.391 r0.3
  lines w0.1: -0.652,0 0.348,0 ; -0.152,-0.5 -0.152,0.5 ; -11.633,-11.481 -11.633,11.481 11.328,11.481 11.328,-11.481 -11.633,-11.481
  lines w0.254: -9.705,-9.563 9.345,-9.563 9.345,9.537 -8.892,9.537 -9.705,8.725 -9.705,-9.563
3D body "lqfp144.stp": height 1.5, standoff 0, extent -11.152,-11 10.848,11

## LQFP176_0.5MM [mm]
height 1.6
pads (176):
  rect 1.35x0.27 smd: 1(-12.625,10.75) 2(-12.625,10.25) 3(-12.625,9.75) 4(-12.625,9.25) 5(-12.625,8.75) 6(-12.625,8.25) 7(-12.625,7.75) 8(-12.625,7.25) 9(-12.625,6.75) 10(-12.625,6.25) 11(-12.625,5.75) 12(-12.625,5.25) 13(-12.625,4.75) 14(-12.625,4.25) 15(-12.625,3.75) 16(-12.625,3.25) 17(-12.625,2.75) 18(-12.625,2.25) 19(-12.625,1.75) 20(-12.625,1.25) 21(-12.625,0.75) 22(-12.625,0.25) 23(-12.625,-0.25) 24(-12.625,-0.75) 25(-12.625,-1.25) 26(-12.625,-1.75) 27(-12.625,-2.25) 28(-12.625,-2.75) 29(-12.625,-3.25) 30(-12.625,-3.75) 31(-12.625,-4.25) 32(-12.625,-4.75) 33(-12.625,-5.25) 34(-12.625,-5.75) 35(-12.625,-6.25) 36(-12.625,-6.75) 37(-12.625,-7.25) 38(-12.625,-7.75) 39(-12.625,-8.25) 40(-12.625,-8.75) 41(-12.625,-9.25) 42(-12.625,-9.75) 43(-12.625,-10.25) 44(-12.625,-10.75) 89(12.625,-10.75) 90(12.625,-10.25) 91(12.625,-9.75) 92(12.625,-9.25) 93(12.625,-8.75) 94(12.625,-8.25) 95(12.625,-7.75) 96(12.625,-7.25) 97(12.625,-6.75) 98(12.625,-6.25) 99(12.625,-5.75) 100(12.625,-5.25) 101(12.625,-4.75) 102(12.625,-4.25) 103(12.625,-3.75) 104(12.625,-3.25) 105(12.625,-2.75) 106(12.625,-2.25) 107(12.625,-1.75) 108(12.625,-1.25) 109(12.625,-0.75) 110(12.625,-0.25) 111(12.625,0.25) 112(12.625,0.75) 113(12.625,1.25) 114(12.625,1.75) 115(12.625,2.25) 116(12.625,2.75) 117(12.625,3.25) 118(12.625,3.75) 119(12.625,4.25) 120(12.625,4.75) 121(12.625,5.25) 122(12.625,5.75) 123(12.625,6.25) 124(12.625,6.75) 125(12.625,7.25) 126(12.625,7.75) 127(12.625,8.25) 128(12.625,8.75) 129(12.625,9.25) 130(12.625,9.75) 131(12.625,10.25) 132(12.625,10.75)
  rect 0.27x1.35 smd: 45(-10.75,-12.625) 46(-10.25,-12.625) 47(-9.75,-12.625) 48(-9.25,-12.625) 49(-8.75,-12.625) 50(-8.25,-12.625) 51(-7.75,-12.625) 52(-7.25,-12.625) 53(-6.75,-12.625) 54(-6.25,-12.625) 55(-5.75,-12.625) 56(-5.25,-12.625) 57(-4.75,-12.625) 58(-4.25,-12.625) 59(-3.75,-12.625) 60(-3.25,-12.625) 61(-2.75,-12.625) 62(-2.25,-12.625) 63(-1.75,-12.625) 64(-1.25,-12.625) 65(-0.75,-12.625) 66(-0.25,-12.625) 67(0.25,-12.625) 68(0.75,-12.625) 69(1.25,-12.625) 70(1.75,-12.625) 71(2.25,-12.625) 72(2.75,-12.625) 73(3.25,-12.625) 74(3.75,-12.625) 75(4.25,-12.625) 76(4.75,-12.625) 77(5.25,-12.625) 78(5.75,-12.625) 79(6.25,-12.625) 80(6.75,-12.625) 81(7.25,-12.625) 82(7.75,-12.625) 83(8.25,-12.625) 84(8.75,-12.625) 85(9.25,-12.625) 86(9.75,-12.625) 87(10.25,-12.625) 88(10.75,-12.625) 133(10.75,12.625) 134(10.25,12.625) 135(9.75,12.625) 136(9.25,12.625) 137(8.75,12.625) 138(8.25,12.625) 139(7.75,12.625) 140(7.25,12.625) 141(6.75,12.625) 142(6.25,12.625) 143(5.75,12.625) 144(5.25,12.625) 145(4.75,12.625) 146(4.25,12.625) 147(3.75,12.625) 148(3.25,12.625) 149(2.75,12.625) 150(2.25,12.625) 151(1.75,12.625) 152(1.25,12.625) 153(0.75,12.625) 154(0.25,12.625) 155(-0.25,12.625) 156(-0.75,12.625) 157(-1.25,12.625) 158(-1.75,12.625) 159(-2.25,12.625) 160(-2.75,12.625) 161(-3.25,12.625) 162(-3.75,12.625) 163(-4.25,12.625) 164(-4.75,12.625) 165(-5.25,12.625) 166(-5.75,12.625) 167(-6.25,12.625) 168(-6.75,12.625) 169(-7.25,12.625) 170(-7.75,12.625) 171(-8.25,12.625) 172(-8.75,12.625) 173(-9.25,12.625) 174(-9.75,12.625) 175(-10.25,12.625) 176(-10.75,12.625)
Top Overlay:
  circle w0.5: c-12.625,11.678 r0.25
Mechanical 15:
  circle w0.6: c-9.722,9.737 r0.3
  lines w0.1: -0.5,0 0.5,0 ; 0,-0.5 0,0.5 ; -13.462,-13.462 -13.462,13.462 13.462,13.462 13.462,-13.462 -13.462,-13.462
  lines w0.2: -11.024,-10.998 10.973,-10.998 10.973,10.947 -9.906,10.947 -11.024,9.83 -11.024,-10.998
3D body "User Library-LQFP176-0_5.STEP": height 1.56, standoff -0.01, extent -12.886,-12.886 12.886,12.886